# Altium schematic symbol library jlcpcb_2025_04_capacitors_extended_0201.schlib: 1175 symbols (part 7 of 7)
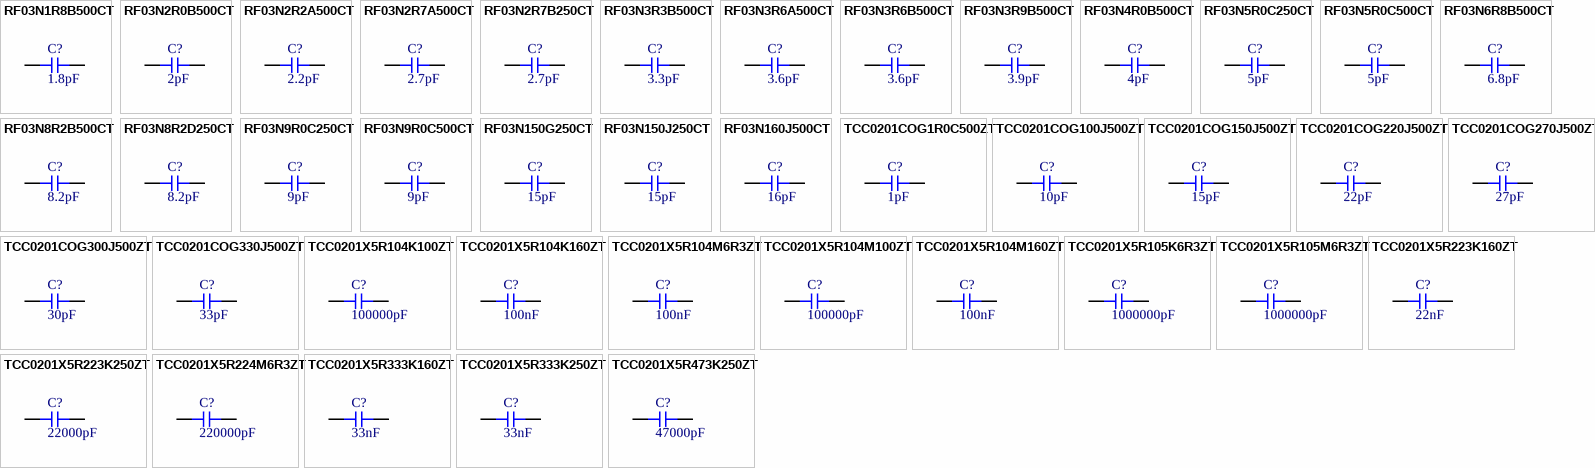
[diagram p35: symbols RF03N1R8B500CT to TCC0201X5R473K250ZT]

## TCC0201COG330J500ZT
designator C?  Capacitance: 33pF  (hidden comment: *)
Capacitor, Ceramic (MLCC), 33pF, ±5%, 50V, C0G, ±5%, SMD 0201; Manufacturer: CCTC; Manufacturer Part Number: TCC0201COG330J500ZT; Package Size: 0201; JLCPCB Basic Part: No; JLCPCB Part Number: C5142543; Supplier 1: LCSC; Category: Capacitors - MLCC; Supplier Part Number 1: C5142543; Tolerance: ±5%; Voltage Rating: 50V; Temperature Coefficient: C0G; RoHS: Yes; ComponentLink1Description: Datasheet; ComponentLink1URL: https://wmsc.lcsc.com/wmsc/upload/file/pdf/v2/lcsc/2209011730_CCTC-TCC0201COG330J500ZT_C5142543.pdf; ComponentLink2Description: JLCPCB Part URL; ComponentLink2URL: https://jlcpcb.com/partdetail/C5142543; ComponentLink3Description: LCSC Part URL; ComponentLink3URL: https://lcsc.com/product-detail/Multilayer-Ceramic-Capacitors-MLCC---SMD-SMT_CCTC-CCTC-TCC0201COG330J500ZT_C5142543.html
footprint CAP-0201 (0201 (0603M) Capacitor)
pins: 1, 2

## TCC0201X5R104K100ZT
designator C?  Capacitance: 100000pF  (hidden comment: *)
Capacitor, Ceramic (MLCC), 100000pF, ±10%, 10V, X5R, ±10%, SMD 0201; Manufacturer: CCTC; Manufacturer Part Number: TCC0201X5R104K100ZT; Package Size: 0201; JLCPCB Basic Part: No; JLCPCB Part Number: C5142565; Supplier 1: LCSC; Category: Capacitors - MLCC; Supplier Part Number 1: C5142565; Tolerance: ±10%; Voltage Rating: 10V; Temperature Coefficient: X5R; RoHS: Yes; ComponentLink1Description: Datasheet; ComponentLink1URL: https://wmsc.lcsc.com/wmsc/upload/file/pdf/v2/lcsc/2209011730_CCTC-TCC0201X5R104K100ZT_C5142565.pdf; ComponentLink2Description: JLCPCB Part URL; ComponentLink2URL: https://jlcpcb.com/partdetail/C5142565; ComponentLink3Description: LCSC Part URL; ComponentLink3URL: https://lcsc.com/product-detail/Multilayer-Ceramic-Capacitors-MLCC---SMD-SMT_CCTC-CCTC-TCC0201X5R104K100ZT_C5142565.html
footprint CAP-0201 (0201 (0603M) Capacitor)
pins: 1, 2

## TCC0201X5R104K160ZT
designator C?  Capacitance: 100nF  (hidden comment: *)
Capacitor, Ceramic (MLCC), 100nF, ±10%, 16V, X5R, ±10%, SMD 0201; Manufacturer: CCTC; Manufacturer Part Number: TCC0201X5R104K160ZT; Package Size: 0201; JLCPCB Basic Part: No; JLCPCB Part Number: C2903663; Supplier 1: LCSC; Category: Capacitors - MLCC; Supplier Part Number 1: C2903663; Tolerance: ±10%; Voltage Rating: 16V; Temperature Coefficient: X5R; RoHS: Yes; ComponentLink1Description: Datasheet; ComponentLink1URL: https://wmsc.lcsc.com/wmsc/upload/file/pdf/v2/lcsc/2110101130_CCTC-TCC0201X5R104K160ZT_C2903663.pdf; ComponentLink2Description: JLCPCB Part URL; ComponentLink2URL: https://jlcpcb.com/partdetail/C2903663; ComponentLink3Description: LCSC Part URL; ComponentLink3URL: https://lcsc.com/product-detail/Multilayer-Ceramic-Capacitors-MLCC---SMD-SMT_CCTC-CCTC-TCC0201X5R104K160ZT_C2903663.html
footprint CAP-0201 (0201 (0603M) Capacitor)
pins: 1, 2

## TCC0201X5R104M6R3ZT
designator C?  Capacitance: 100nF  (hidden comment: *)
Capacitor, Ceramic (MLCC), 100nF, 6.3V, Y5V, SMD 0201; Manufacturer: CCTC; Manufacturer Part Number: TCC0201X5R104M6R3ZT; Package Size: 0201; JLCPCB Basic Part: No; JLCPCB Part Number: C2903664; Supplier 1: LCSC; Category: Capacitors - MLCC; Supplier Part Number 1: C2903664; Voltage Rating: 6.3V; Temperature Coefficient: Y5V; RoHS: Yes; ComponentLink1Description: Datasheet; ComponentLink1URL: https://wmsc.lcsc.com/wmsc/upload/file/pdf/v2/lcsc/2110101130_CCTC-TCC0201X5R104M6R3ZT_C2903664.pdf; ComponentLink2Description: JLCPCB Part URL; ComponentLink2URL: https://jlcpcb.com/partdetail/C2903664; ComponentLink3Description: LCSC Part URL; ComponentLink3URL: https://lcsc.com/product-detail/Multilayer-Ceramic-Capacitors-MLCC---SMD-SMT_CCTC-CCTC-TCC0201X5R104M6R3ZT_C2903664.html
footprint CAP-0201 (0201 (0603M) Capacitor)
pins: 1, 2

## TCC0201X5R104M100ZT
designator C?  Capacitance: 100000pF  (hidden comment: *)
Capacitor, Ceramic (MLCC), 100000pF, ±20%, 10V, X5R, ±20%, SMD 0201; Manufacturer: CCTC; Manufacturer Part Number: TCC0201X5R104M100ZT; Package Size: 0201; JLCPCB Basic Part: No; JLCPCB Part Number: C5142537; Supplier 1: LCSC; Category: Capacitors - MLCC; Supplier Part Number 1: C5142537; Tolerance: ±20%; Voltage Rating: 10V; Temperature Coefficient: X5R; RoHS: Yes; ComponentLink1Description: Datasheet; ComponentLink1URL: https://wmsc.lcsc.com/wmsc/upload/file/pdf/v2/lcsc/2209011730_CCTC-TCC0201X5R104M100ZT_C5142537.pdf; ComponentLink2Description: JLCPCB Part URL; ComponentLink2URL: https://jlcpcb.com/partdetail/C5142537; ComponentLink3Description: LCSC Part URL; ComponentLink3URL: https://lcsc.com/product-detail/Multilayer-Ceramic-Capacitors-MLCC---SMD-SMT_CCTC-CCTC-TCC0201X5R104M100ZT_C5142537.html
footprint CAP-0201 (0201 (0603M) Capacitor)
pins: 1, 2

## TCC0201X5R104M160ZT
designator C?  Capacitance: 100nF  (hidden comment: *)
Capacitor, Ceramic (MLCC), 100nF, ±20%, 16V, X5R, ±20%, SMD 0201; Manufacturer: CCTC; Manufacturer Part Number: TCC0201X5R104M160ZT; Package Size: 0201; JLCPCB Basic Part: No; JLCPCB Part Number: C7393831; Supplier 1: LCSC; Category: Capacitors - MLCC; Supplier Part Number 1: C7393831; Tolerance: ±20%; Voltage Rating: 16V; Temperature Coefficient: X5R; RoHS: Yes; ComponentLink1Description: Datasheet; ComponentLink1URL: https://wmsc.lcsc.com/wmsc/upload/file/pdf/v2/lcsc/2306211554_CCTC-TCC0201X5R104M160ZT_C7393831.pdf; ComponentLink2Description: JLCPCB Part URL; ComponentLink2URL: https://jlcpcb.com/partdetail/C7393831; ComponentLink3Description: LCSC Part URL; ComponentLink3URL: https://lcsc.com/product-detail/Multilayer-Ceramic-Capacitors-MLCC---SMD-SMT_CCTC-CCTC-TCC0201X5R104M160ZT_C7393831.html
footprint CAP-0201 (0201 (0603M) Capacitor)
pins: 1, 2

## TCC0201X5R105K6R3ZT
designator C?  Capacitance: 1000000pF  (hidden comment: *)
Capacitor, Ceramic (MLCC), 1000000pF, ±10%, 6.3V, X5R, ±10%, SMD 0201; Manufacturer: CCTC; Manufacturer Part Number: TCC0201X5R105K6R3ZT; Package Size: 0201; JLCPCB Basic Part: No; JLCPCB Part Number: C5142566; Supplier 1: LCSC; Category: Capacitors - MLCC; Supplier Part Number 1: C5142566; Tolerance: ±10%; Voltage Rating: 6.3V; Temperature Coefficient: X5R; RoHS: Yes; ComponentLink1Description: Datasheet; ComponentLink1URL: https://wmsc.lcsc.com/wmsc/upload/file/pdf/v2/lcsc/2209011730_CCTC-TCC0201X5R105K6R3ZT_C5142566.pdf; ComponentLink2Description: JLCPCB Part URL; ComponentLink2URL: https://jlcpcb.com/partdetail/C5142566; ComponentLink3Description: LCSC Part URL; ComponentLink3URL: https://lcsc.com/product-detail/Multilayer-Ceramic-Capacitors-MLCC---SMD-SMT_CCTC-CCTC-TCC0201X5R105K6R3ZT_C5142566.html
footprint CAP-0201 (0201 (0603M) Capacitor)
pins: 1, 2

## TCC0201X5R105M6R3ZT
designator C?  Capacitance: 1000000pF  (hidden comment: *)
Capacitor, Ceramic (MLCC), 1000000pF, ±20%, 6.3V, X5R, ±20%, SMD 0201; Manufacturer: CCTC; Manufacturer Part Number: TCC0201X5R105M6R3ZT; Package Size: 0201; JLCPCB Basic Part: No; JLCPCB Part Number: C5142562; Supplier 1: LCSC; Category: Capacitors - MLCC; Supplier Part Number 1: C5142562; Tolerance: ±20%; Voltage Rating: 6.3V; Temperature Coefficient: X5R; RoHS: Yes; ComponentLink1Description: Datasheet; ComponentLink1URL: https://wmsc.lcsc.com/wmsc/upload/file/pdf/v2/lcsc/2209011730_CCTC-TCC0201X5R105M6R3ZT_C5142562.pdf; ComponentLink2Description: JLCPCB Part URL; ComponentLink2URL: https://jlcpcb.com/partdetail/C5142562; ComponentLink3Description: LCSC Part URL; ComponentLink3URL: https://lcsc.com/product-detail/Multilayer-Ceramic-Capacitors-MLCC---SMD-SMT_CCTC-CCTC-TCC0201X5R105M6R3ZT_C5142562.html
footprint CAP-0201 (0201 (0603M) Capacitor)
pins: 1, 2

## TCC0201X5R223K160ZT
designator C?  Capacitance: 22nF  (hidden comment: *)
Capacitor, Ceramic (MLCC), 22nF, ±10%, 16V, X5R, ±10%, SMD 0201; Manufacturer: CCTC; Manufacturer Part Number: TCC0201X5R223K160ZT; Package Size: 0201; JLCPCB Basic Part: No; JLCPCB Part Number: C18164585; Supplier 1: LCSC; Category: Capacitors - MLCC; Supplier Part Number 1: C18164585; Tolerance: ±10%; Voltage Rating: 16V; Temperature Coefficient: X5R; RoHS: Yes; ComponentLink1Description: Datasheet; ComponentLink1URL: https://wmsc.lcsc.com/wmsc/upload/file/pdf/v2/lcsc/2309141701_CCTC-TCC0201X5R223K160ZT_C18164585.pdf; ComponentLink2Description: JLCPCB Part URL; ComponentLink2URL: https://jlcpcb.com/partdetail/C18164585; ComponentLink3Description: LCSC Part URL; ComponentLink3URL: https://lcsc.com/product-detail/Multilayer-Ceramic-Capacitors-MLCC---SMD-SMT_CCTC-CCTC-TCC0201X5R223K160ZT_C18164585.html
footprint CAP-0201 (0201 (0603M) Capacitor)
pins: 1, 2

## TCC0201X5R223K250ZT
designator C?  Capacitance: 22000pF  (hidden comment: *)
Capacitor, Ceramic (MLCC), 22000pF, ±10%, 25V, X5R, ±10%, SMD 0201; Manufacturer: CCTC; Manufacturer Part Number: TCC0201X5R223K250ZT; Package Size: 0201; JLCPCB Basic Part: No; JLCPCB Part Number: C5142560; Supplier 1: LCSC; Category: Capacitors - MLCC; Supplier Part Number 1: C5142560; Tolerance: ±10%; Voltage Rating: 25V; Temperature Coefficient: X5R; RoHS: Yes; ComponentLink1Description: Datasheet; ComponentLink1URL: https://wmsc.lcsc.com/wmsc/upload/file/pdf/v2/lcsc/2209011730_CCTC-TCC0201X5R223K250ZT_C5142560.pdf; ComponentLink2Description: JLCPCB Part URL; ComponentLink2URL: https://jlcpcb.com/partdetail/C5142560; ComponentLink3Description: LCSC Part URL; ComponentLink3URL: https://lcsc.com/product-detail/Multilayer-Ceramic-Capacitors-MLCC---SMD-SMT_CCTC-CCTC-TCC0201X5R223K250ZT_C5142560.html
footprint CAP-0201 (0201 (0603M) Capacitor)
pins: 1, 2

## TCC0201X5R224M6R3ZT
designator C?  Capacitance: 220000pF  (hidden comment: *)
Capacitor, Ceramic (MLCC), 220000pF, ±20%, 6.3V, X5R, ±20%, SMD 0201; Manufacturer: CCTC; Manufacturer Part Number: TCC0201X5R224M6R3ZT; Package Size: 0201; JLCPCB Basic Part: No; JLCPCB Part Number: C5142538; Supplier 1: LCSC; Category: Capacitors - MLCC; Supplier Part Number 1: C5142538; Tolerance: ±20%; Voltage Rating: 6.3V; Temperature Coefficient: X5R; RoHS: Yes; ComponentLink1Description: Datasheet; ComponentLink1URL: https://wmsc.lcsc.com/wmsc/upload/file/pdf/v2/lcsc/2209011730_CCTC-TCC0201X5R224M6R3ZT_C5142538.pdf; ComponentLink2Description: JLCPCB Part URL; ComponentLink2URL: https://jlcpcb.com/partdetail/C5142538; ComponentLink3Description: LCSC Part URL; ComponentLink3URL: https://lcsc.com/product-detail/Multilayer-Ceramic-Capacitors-MLCC---SMD-SMT_CCTC-CCTC-TCC0201X5R224M6R3ZT_C5142538.html
footprint CAP-0201 (0201 (0603M) Capacitor)
pins: 1, 2

## TCC0201X5R333K160ZT
designator C?  Capacitance: 33nF  (hidden comment: *)
Capacitor, Ceramic (MLCC), 33nF, ±10%, 16V, X5R, ±10%, SMD 0201; Manufacturer: CCTC; Manufacturer Part Number: TCC0201X5R333K160ZT; Package Size: 0201; JLCPCB Basic Part: No; JLCPCB Part Number: C7393832; Supplier 1: LCSC; Category: Capacitors - MLCC; Supplier Part Number 1: C7393832; Tolerance: ±10%; Voltage Rating: 16V; Temperature Coefficient: X5R; RoHS: Yes; ComponentLink1Description: Datasheet; ComponentLink1URL: https://wmsc.lcsc.com/wmsc/upload/file/pdf/v2/lcsc/2306211554_CCTC-TCC0201X5R333K160ZT_C7393832.pdf; ComponentLink2Description: JLCPCB Part URL; ComponentLink2URL: https://jlcpcb.com/partdetail/C7393832; ComponentLink3Description: LCSC Part URL; ComponentLink3URL: https://lcsc.com/product-detail/Multilayer-Ceramic-Capacitors-MLCC---SMD-SMT_CCTC-CCTC-TCC0201X5R333K160ZT_C7393832.html
footprint CAP-0201 (0201 (0603M) Capacitor)
pins: 1, 2

## TCC0201X5R333K250ZT
designator C?  Capacitance: 33nF  (hidden comment: *)
Capacitor, Ceramic (MLCC), 33nF, ±10%, 25V, X5R, ±10%, SMD 0201; Manufacturer: CCTC; Manufacturer Part Number: TCC0201X5R333K250ZT; Package Size: 0201; JLCPCB Basic Part: No; JLCPCB Part Number: C5142554; Supplier 1: LCSC; Category: Capacitors - MLCC; Supplier Part Number 1: C5142554; Tolerance: ±10%; Voltage Rating: 25V; Temperature Coefficient: X5R; RoHS: Yes; ComponentLink1Description: Datasheet; ComponentLink1URL: https://wmsc.lcsc.com/wmsc/upload/file/pdf/v2/lcsc/2209011730_CCTC-TCC0201X5R333K250ZT_C5142554.pdf; ComponentLink2Description: JLCPCB Part URL; ComponentLink2URL: https://jlcpcb.com/partdetail/C5142554; ComponentLink3Description: LCSC Part URL; ComponentLink3URL: https://lcsc.com/product-detail/Multilayer-Ceramic-Capacitors-MLCC---SMD-SMT_CCTC-CCTC-TCC0201X5R333K250ZT_C5142554.html
footprint CAP-0201 (0201 (0603M) Capacitor)
pins: 1, 2

## TCC0201X5R473K250ZT
designator C?  Capacitance: 47000pF  (hidden comment: *)
Capacitor, Ceramic (MLCC), 47000pF, ±10%, 25V, X5R, ±10%, SMD 0201; Manufacturer: CCTC; Manufacturer Part Number: TCC0201X5R473K250ZT; Package Size: 0201; JLCPCB Basic Part: No; JLCPCB Part Number: C5142564; Supplier 1: LCSC; Category: Capacitors - MLCC; Supplier Part Number 1: C5142564; Tolerance: ±10%; Voltage Rating: 25V; Temperature Coefficient: X5R; RoHS: Yes; ComponentLink1Description: Datasheet; ComponentLink1URL: https://wmsc.lcsc.com/wmsc/upload/file/pdf/v2/lcsc/2209011730_CCTC-TCC0201X5R473K250ZT_C5142564.pdf; ComponentLink2Description: JLCPCB Part URL; ComponentLink2URL: https://jlcpcb.com/partdetail/C5142564; ComponentLink3Description: LCSC Part URL; ComponentLink3URL: https://lcsc.com/product-detail/Multilayer-Ceramic-Capacitors-MLCC---SMD-SMT_CCTC-CCTC-TCC0201X5R473K250ZT_C5142564.html
footprint CAP-0201 (0201 (0603M) Capacitor)
pins: 1, 2

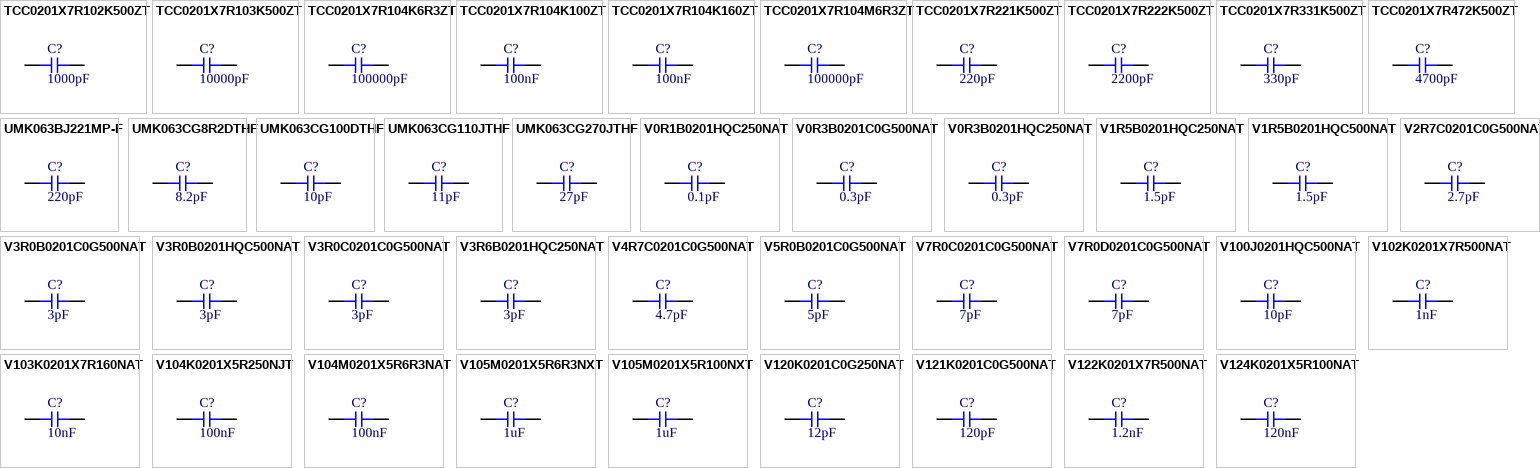
[diagram p28: symbols TCC0201X7R102K500ZT to V124K0201X5R100NAT]

## TCC0201X7R102K500ZT
designator C?  Capacitance: 1000pF  (hidden comment: *)
Capacitor, Ceramic (MLCC), 1000pF, ±10%, 50V, X7R, ±10%, SMD 0201; Manufacturer: CCTC; Manufacturer Part Number: TCC0201X7R102K500ZT; Package Size: 0201; JLCPCB Basic Part: No; JLCPCB Part Number: C5142559; Supplier 1: LCSC; Category: Capacitors - MLCC; Supplier Part Number 1: C5142559; Tolerance: ±10%; Voltage Rating: 50V; Temperature Coefficient: X7R; RoHS: Yes; ComponentLink1Description: Datasheet; ComponentLink1URL: https://wmsc.lcsc.com/wmsc/upload/file/pdf/v2/lcsc/2209011730_CCTC-TCC0201X7R102K500ZT_C5142559.pdf; ComponentLink2Description: JLCPCB Part URL; ComponentLink2URL: https://jlcpcb.com/partdetail/C5142559; ComponentLink3Description: LCSC Part URL; ComponentLink3URL: https://lcsc.com/product-detail/Multilayer-Ceramic-Capacitors-MLCC---SMD-SMT_CCTC-CCTC-TCC0201X7R102K500ZT_C5142559.html
footprint CAP-0201 (0201 (0603M) Capacitor)
pins: 1, 2

## TCC0201X7R103K500ZT
designator C?  Capacitance: 10000pF  (hidden comment: *)
Capacitor, Ceramic (MLCC), 10000pF, ±10%, 50V, X7R, ±10%, SMD 0201; Manufacturer: CCTC; Manufacturer Part Number: TCC0201X7R103K500ZT; Package Size: 0201; JLCPCB Basic Part: No; JLCPCB Part Number: C5142551; Supplier 1: LCSC; Category: Capacitors - MLCC; Supplier Part Number 1: C5142551; Tolerance: ±10%; Voltage Rating: 50V; Temperature Coefficient: X7R; RoHS: Yes; ComponentLink1Description: Datasheet; ComponentLink1URL: https://wmsc.lcsc.com/wmsc/upload/file/pdf/v2/lcsc/2209011730_CCTC-TCC0201X7R103K500ZT_C5142551.pdf; ComponentLink2Description: JLCPCB Part URL; ComponentLink2URL: https://jlcpcb.com/partdetail/C5142551; ComponentLink3Description: LCSC Part URL; ComponentLink3URL: https://lcsc.com/product-detail/Multilayer-Ceramic-Capacitors-MLCC---SMD-SMT_CCTC-CCTC-TCC0201X7R103K500ZT_C5142551.html
footprint CAP-0201 (0201 (0603M) Capacitor)
pins: 1, 2

## TCC0201X7R104K6R3ZT
designator C?  Capacitance: 100000pF  (hidden comment: *)
Capacitor, Ceramic (MLCC), 100000pF, ±10%, 6.3V, X7R, ±10%, SMD 0201; Manufacturer: CCTC; Manufacturer Part Number: TCC0201X7R104K6R3ZT; Package Size: 0201; JLCPCB Basic Part: No; JLCPCB Part Number: C5142541; Supplier 1: LCSC; Category: Capacitors - MLCC; Supplier Part Number 1: C5142541; Tolerance: ±10%; Voltage Rating: 6.3V; Temperature Coefficient: X7R; RoHS: Yes; ComponentLink1Description: Datasheet; ComponentLink1URL: https://wmsc.lcsc.com/wmsc/upload/file/pdf/v2/lcsc/2209011730_CCTC-TCC0201X7R104K6R3ZT_C5142541.pdf; ComponentLink2Description: JLCPCB Part URL; ComponentLink2URL: https://jlcpcb.com/partdetail/C5142541; ComponentLink3Description: LCSC Part URL; ComponentLink3URL: https://lcsc.com/product-detail/Multilayer-Ceramic-Capacitors-MLCC---SMD-SMT_CCTC-CCTC-TCC0201X7R104K6R3ZT_C5142541.html
footprint CAP-0201 (0201 (0603M) Capacitor)
pins: 1, 2

## TCC0201X7R104K100ZT
designator C?  Capacitance: 100nF  (hidden comment: *)
Capacitor, Ceramic (MLCC), 100nF, ±10%, 10V, X7R, ±10%, SMD 0201; Manufacturer: CCTC; Manufacturer Part Number: TCC0201X7R104K100ZT; Package Size: 0201; JLCPCB Basic Part: No; JLCPCB Part Number: C7393837; Supplier 1: LCSC; Category: Capacitors - MLCC; Supplier Part Number 1: C7393837; Tolerance: ±10%; Voltage Rating: 10V; Temperature Coefficient: X7R; RoHS: Yes; ComponentLink1Description: Datasheet; ComponentLink1URL: https://wmsc.lcsc.com/wmsc/upload/file/pdf/v2/lcsc/2306211554_CCTC-TCC0201X7R104K100ZT_C7393837.pdf; ComponentLink2Description: JLCPCB Part URL; ComponentLink2URL: https://jlcpcb.com/partdetail/C7393837; ComponentLink3Description: LCSC Part URL; ComponentLink3URL: https://lcsc.com/product-detail/Multilayer-Ceramic-Capacitors-MLCC---SMD-SMT_CCTC-CCTC-TCC0201X7R104K100ZT_C7393837.html
footprint CAP-0201 (0201 (0603M) Capacitor)
pins: 1, 2

## TCC0201X7R104K160ZT
designator C?  Capacitance: 100nF  (hidden comment: *)
Capacitor, Ceramic (MLCC), 100nF, ±10%, 16V, X7R, ±10%, SMD 0201; Manufacturer: CCTC; Manufacturer Part Number: TCC0201X7R104K160ZT; Package Size: 0201; JLCPCB Basic Part: No; JLCPCB Part Number: C18164586; Supplier 1: LCSC; Category: Capacitors - MLCC; Supplier Part Number 1: C18164586; Tolerance: ±10%; Voltage Rating: 16V; Temperature Coefficient: X7R; RoHS: Yes; ComponentLink1Description: Datasheet; ComponentLink1URL: https://wmsc.lcsc.com/wmsc/upload/file/pdf/v2/lcsc/2309141701_CCTC-TCC0201X7R104K160ZT_C18164586.pdf; ComponentLink2Description: JLCPCB Part URL; ComponentLink2URL: https://jlcpcb.com/partdetail/C18164586; ComponentLink3Description: LCSC Part URL; ComponentLink3URL: https://lcsc.com/product-detail/Multilayer-Ceramic-Capacitors-MLCC---SMD-SMT_CCTC-CCTC-TCC0201X7R104K160ZT_C18164586.html
footprint CAP-0201 (0201 (0603M) Capacitor)
pins: 1, 2

## TCC0201X7R104M6R3ZT
designator C?  Capacitance: 100000pF  (hidden comment: *)
Capacitor, Ceramic (MLCC), 100000pF, ±20%, 6.3V, X7R, ±20%, SMD 0201; Manufacturer: CCTC; Manufacturer Part Number: TCC0201X7R104M6R3ZT; Package Size: 0201; JLCPCB Basic Part: No; JLCPCB Part Number: C5142563; Supplier 1: LCSC; Category: Capacitors - MLCC; Supplier Part Number 1: C5142563; Tolerance: ±20%; Voltage Rating: 6.3V; Temperature Coefficient: X7R; RoHS: Yes; ComponentLink1Description: Datasheet; ComponentLink1URL: https://wmsc.lcsc.com/wmsc/upload/file/pdf/v2/lcsc/2209011730_CCTC-TCC0201X7R104M6R3ZT_C5142563.pdf; ComponentLink2Description: JLCPCB Part URL; ComponentLink2URL: https://jlcpcb.com/partdetail/C5142563; ComponentLink3Description: LCSC Part URL; ComponentLink3URL: https://lcsc.com/product-detail/Multilayer-Ceramic-Capacitors-MLCC---SMD-SMT_CCTC-CCTC-TCC0201X7R104M6R3ZT_C5142563.html
footprint CAP-0201 (0201 (0603M) Capacitor)
pins: 1, 2

## TCC0201X7R221K500ZT
designator C?  Capacitance: 220pF  (hidden comment: *)
Capacitor, Ceramic (MLCC), 220pF, ±10%, 50V, X7R, ±10%, SMD 0201; Manufacturer: CCTC; Manufacturer Part Number: TCC0201X7R221K500ZT; Package Size: 0201; JLCPCB Basic Part: No; JLCPCB Part Number: C5142555; Supplier 1: LCSC; Category: Capacitors - MLCC; Supplier Part Number 1: C5142555; Tolerance: ±10%; Voltage Rating: 50V; Temperature Coefficient: X7R; RoHS: Yes; ComponentLink1Description: Datasheet; ComponentLink1URL: https://wmsc.lcsc.com/wmsc/upload/file/pdf/v2/lcsc/2209011730_CCTC-TCC0201X7R221K500ZT_C5142555.pdf; ComponentLink2Description: JLCPCB Part URL; ComponentLink2URL: https://jlcpcb.com/partdetail/C5142555; ComponentLink3Description: LCSC Part URL; ComponentLink3URL: https://lcsc.com/product-detail/Multilayer-Ceramic-Capacitors-MLCC---SMD-SMT_CCTC-CCTC-TCC0201X7R221K500ZT_C5142555.html
footprint CAP-0201 (0201 (0603M) Capacitor)
pins: 1, 2

## TCC0201X7R222K500ZT
designator C?  Capacitance: 2200pF  (hidden comment: *)
Capacitor, Ceramic (MLCC), 2200pF, ±10%, 50V, X7R, ±10%, SMD 0201; Manufacturer: CCTC; Manufacturer Part Number: TCC0201X7R222K500ZT; Package Size: 0201; JLCPCB Basic Part: No; JLCPCB Part Number: C5142540; Supplier 1: LCSC; Category: Capacitors - MLCC; Supplier Part Number 1: C5142540; Tolerance: ±10%; Voltage Rating: 50V; Temperature Coefficient: X7R; RoHS: Yes; ComponentLink1Description: Datasheet; ComponentLink1URL: https://wmsc.lcsc.com/wmsc/upload/file/pdf/v2/lcsc/2209011730_CCTC-TCC0201X7R222K500ZT_C5142540.pdf; ComponentLink2Description: JLCPCB Part URL; ComponentLink2URL: https://jlcpcb.com/partdetail/C5142540; ComponentLink3Description: LCSC Part URL; ComponentLink3URL: https://lcsc.com/product-detail/Multilayer-Ceramic-Capacitors-MLCC---SMD-SMT_CCTC-CCTC-TCC0201X7R222K500ZT_C5142540.html
footprint CAP-0201 (0201 (0603M) Capacitor)
pins: 1, 2

## TCC0201X7R331K500ZT
designator C?  Capacitance: 330pF  (hidden comment: *)
Capacitor, Ceramic (MLCC), 330pF, ±10%, 50V, X7R, ±10%, SMD 0201; Manufacturer: CCTC; Manufacturer Part Number: TCC0201X7R331K500ZT; Package Size: 0201; JLCPCB Basic Part: No; JLCPCB Part Number: C5142553; Supplier 1: LCSC; Category: Capacitors - MLCC; Supplier Part Number 1: C5142553; Tolerance: ±10%; Voltage Rating: 50V; Temperature Coefficient: X7R; RoHS: Yes; ComponentLink1Description: Datasheet; ComponentLink1URL: https://wmsc.lcsc.com/wmsc/upload/file/pdf/v2/lcsc/2209011730_CCTC-TCC0201X7R331K500ZT_C5142553.pdf; ComponentLink2Description: JLCPCB Part URL; ComponentLink2URL: https://jlcpcb.com/partdetail/C5142553; ComponentLink3Description: LCSC Part URL; ComponentLink3URL: https://lcsc.com/product-detail/Multilayer-Ceramic-Capacitors-MLCC---SMD-SMT_CCTC-CCTC-TCC0201X7R331K500ZT_C5142553.html
footprint CAP-0201 (0201 (0603M) Capacitor)
pins: 1, 2

## TCC0201X7R472K500ZT
designator C?  Capacitance: 4700pF  (hidden comment: *)
Capacitor, Ceramic (MLCC), 4700pF, ±10%, 50V, X7R, ±10%, SMD 0201; Manufacturer: CCTC; Manufacturer Part Number: TCC0201X7R472K500ZT; Package Size: 0201; JLCPCB Basic Part: No; JLCPCB Part Number: C5142549; Supplier 1: LCSC; Category: Capacitors - MLCC; Supplier Part Number 1: C5142549; Tolerance: ±10%; Voltage Rating: 50V; Temperature Coefficient: X7R; RoHS: Yes; ComponentLink1Description: Datasheet; ComponentLink1URL: https://wmsc.lcsc.com/wmsc/upload/file/pdf/v2/lcsc/2209011730_CCTC-TCC0201X7R472K500ZT_C5142549.pdf; ComponentLink2Description: JLCPCB Part URL; ComponentLink2URL: https://jlcpcb.com/partdetail/C5142549; ComponentLink3Description: LCSC Part URL; ComponentLink3URL: https://lcsc.com/product-detail/Multilayer-Ceramic-Capacitors-MLCC---SMD-SMT_CCTC-CCTC-TCC0201X7R472K500ZT_C5142549.html
footprint CAP-0201 (0201 (0603M) Capacitor)
pins: 1, 2

## UMK063BJ221MP-F
designator C?  Capacitance: 220pF  (hidden comment: *)
Capacitor, Ceramic (MLCC), 220pF, ±20%, 50V, X5R, ±20%, SMD 0201; Manufacturer: Taiyo Yuden; Manufacturer Part Number: UMK063BJ221MP-F; Package Size: 0201; JLCPCB Basic Part: No; JLCPCB Part Number: C524925; Supplier 1: LCSC; Category: Capacitors - MLCC; Supplier Part Number 1: C524925; Tolerance: ±20%; Voltage Rating: 50V; Temperature Coefficient: X5R; RoHS: Yes; ComponentLink1Description: Datasheet; ComponentLink1URL: https://wmsc.lcsc.com/wmsc/upload/file/pdf/v2/lcsc/2304140030_Taiyo-Yuden-UMK063BJ221MP-F_C524925.pdf; ComponentLink2Description: JLCPCB Part URL; ComponentLink2URL: https://jlcpcb.com/partdetail/C524925; ComponentLink3Description: LCSC Part URL; ComponentLink3URL: https://lcsc.com/product-detail/Multilayer-Ceramic-Capacitors-MLCC---SMD-SMT_Taiyo-Yuden-Taiyo-Yuden-UMK063BJ221MP-F_C524925.html
footprint CAP-0201 (0201 (0603M) Capacitor)
pins: 1, 2

## UMK063CG8R2DTHF
designator C?  Capacitance: 8.2pF  (hidden comment: *)
Capacitor, Ceramic (MLCC), 8.2pF, 50V, C0G, SMD 0201; Manufacturer: Taiyo Yuden; Manufacturer Part Number: UMK063CG8R2DTHF; Package Size: 0201; JLCPCB Basic Part: No; JLCPCB Part Number: C2173663; Supplier 1: LCSC; Category: Capacitors - MLCC; Supplier Part Number 1: C2173663; Voltage Rating: 50V; Temperature Coefficient: C0G; RoHS: Yes; ComponentLink1Description: Datasheet; ComponentLink1URL: https://wmsc.lcsc.com/wmsc/upload/file/pdf/v2/lcsc/2309051400_Taiyo-Yuden-UMK063CG8R2DTHF_C2173663.pdf; ComponentLink2Description: JLCPCB Part URL; ComponentLink2URL: https://jlcpcb.com/partdetail/C2173663; ComponentLink3Description: LCSC Part URL; ComponentLink3URL: https://lcsc.com/product-detail/Multilayer-Ceramic-Capacitors-MLCC---SMD-SMT_Taiyo-Yuden-Taiyo-Yuden-UMK063CG8R2DTHF_C2173663.html
footprint CAP-0201 (0201 (0603M) Capacitor)
pins: 1, 2

## UMK063CG100DTHF
designator C?  Capacitance: 10pF  (hidden comment: *)
Capacitor, Ceramic (MLCC), 10pF, 50V, C0G, SMD 0201; Manufacturer: Taiyo Yuden; Manufacturer Part Number: UMK063CG100DTHF; Package Size: 0201; JLCPCB Basic Part: No; JLCPCB Part Number: C2168858; Supplier 1: LCSC; Category: Capacitors - MLCC; Supplier Part Number 1: C2168858; Voltage Rating: 50V; Temperature Coefficient: C0G; RoHS: Yes; ComponentLink1Description: Datasheet; ComponentLink1URL: https://wmsc.lcsc.com/wmsc/upload/file/pdf/v2/lcsc/2309051400_Taiyo-Yuden-UMK063CG100DTHF_C2168858.pdf; ComponentLink2Description: JLCPCB Part URL; ComponentLink2URL: https://jlcpcb.com/partdetail/C2168858; ComponentLink3Description: LCSC Part URL; ComponentLink3URL: https://lcsc.com/product-detail/Multilayer-Ceramic-Capacitors-MLCC---SMD-SMT_Taiyo-Yuden-Taiyo-Yuden-UMK063CG100DTHF_C2168858.html
footprint CAP-0201 (0201 (0603M) Capacitor)
pins: 1, 2

## UMK063CG110JTHF
designator C?  Capacitance: 11pF  (hidden comment: *)
Capacitor, Ceramic (MLCC), 11pF, ±5%, 50V, C0G, ±5%, SMD 0201; Manufacturer: Taiyo Yuden; Manufacturer Part Number: UMK063CG110JTHF; Package Size: 0201; JLCPCB Basic Part: No; JLCPCB Part Number: C2173731; Supplier 1: LCSC; Category: Capacitors - MLCC; Supplier Part Number 1: C2173731; Tolerance: ±5%; Voltage Rating: 50V; Temperature Coefficient: C0G; RoHS: Yes; ComponentLink1Description: Datasheet; ComponentLink1URL: https://wmsc.lcsc.com/wmsc/upload/file/pdf/v2/lcsc/2309051421_Taiyo-Yuden-UMK063CG110JTHF_C2173731.pdf; ComponentLink2Description: JLCPCB Part URL; ComponentLink2URL: https://jlcpcb.com/partdetail/C2173731; ComponentLink3Description: LCSC Part URL; ComponentLink3URL: https://lcsc.com/product-detail/Multilayer-Ceramic-Capacitors-MLCC---SMD-SMT_Taiyo-Yuden-Taiyo-Yuden-UMK063CG110JTHF_C2173731.html
footprint CAP-0201 (0201 (0603M) Capacitor)
pins: 1, 2

## UMK063CG270JTHF
designator C?  Capacitance: 27pF  (hidden comment: *)
Capacitor, Ceramic (MLCC), 27pF, ±5%, 50V, C0G, ±5%, SMD 0201; Manufacturer: Taiyo Yuden; Manufacturer Part Number: UMK063CG270JTHF; Package Size: 0201; JLCPCB Basic Part: No; JLCPCB Part Number: C2173854; Supplier 1: LCSC; Category: Capacitors - MLCC; Supplier Part Number 1: C2173854; Tolerance: ±5%; Voltage Rating: 50V; Temperature Coefficient: C0G; RoHS: Yes; ComponentLink1Description: Datasheet; ComponentLink1URL: https://wmsc.lcsc.com/wmsc/upload/file/pdf/v2/lcsc/2309051359_Taiyo-Yuden-UMK063CG270JTHF_C2173854.pdf; ComponentLink2Description: JLCPCB Part URL; ComponentLink2URL: https://jlcpcb.com/partdetail/C2173854; ComponentLink3Description: LCSC Part URL; ComponentLink3URL: https://lcsc.com/product-detail/Multilayer-Ceramic-Capacitors-MLCC---SMD-SMT_Taiyo-Yuden-Taiyo-Yuden-UMK063CG270JTHF_C2173854.html
footprint CAP-0201 (0201 (0603M) Capacitor)
pins: 1, 2

## V0R1B0201HQC250NAT
designator C?  Capacitance: 0.1pF  (hidden comment: *)
Capacitor, Ceramic (MLCC), 0.1pF, 25V, SMD 0201; Manufacturer: VIIYONG; Manufacturer Part Number: V0R1B0201HQC250NAT; Package Size: 0201; JLCPCB Basic Part: No; JLCPCB Part Number: C2841456; Supplier 1: LCSC; Category: Capacitors - MLCC; Supplier Part Number 1: C2841456; Voltage Rating: 25V; RoHS: Yes; ComponentLink1Description: Datasheet; ComponentLink1URL: https://wmsc.lcsc.com/wmsc/upload/file/pdf/v2/lcsc/2202132030_VIIYONG-V0R1B0201HQC250NAT_C2841456.pdf; ComponentLink2Description: JLCPCB Part URL; ComponentLink2URL: https://jlcpcb.com/partdetail/C2841456; ComponentLink3Description: LCSC Part URL; ComponentLink3URL: https://lcsc.com/product-detail/Multilayer-Ceramic-Capacitors-MLCC---SMD-SMT_VIIYONG-VIIYONG-V0R1B0201HQC250NAT_C2841456.html
footprint CAP-0201 (0201 (0603M) Capacitor)
pins: 1, 2

## V0R3B0201C0G500NAT
designator C?  Capacitance: 0.3pF  (hidden comment: *)
Capacitor, Ceramic (MLCC), 0.3pF, 50V, C0G, SMD 0201; Manufacturer: VIIYONG; Manufacturer Part Number: V0R3B0201C0G500NAT; Package Size: 0201; JLCPCB Basic Part: No; JLCPCB Part Number: C609955; Supplier 1: LCSC; Category: Capacitors - MLCC; Supplier Part Number 1: C609955; Voltage Rating: 50V; Temperature Coefficient: C0G; RoHS: Yes; ComponentLink1Description: Datasheet; ComponentLink1URL: https://wmsc.lcsc.com/wmsc/upload/file/pdf/v2/lcsc/2304140030_VIIYONG-V0R3B0201C0G500NAT_C609955.pdf; ComponentLink2Description: JLCPCB Part URL; ComponentLink2URL: https://jlcpcb.com/partdetail/C609955; ComponentLink3Description: LCSC Part URL; ComponentLink3URL: https://lcsc.com/product-detail/Multilayer-Ceramic-Capacitors-MLCC---SMD-SMT_VIIYONG-VIIYONG-V0R3B0201C0G500NAT_C609955.html
footprint CAP-0201 (0201 (0603M) Capacitor)
pins: 1, 2

## V0R3B0201HQC250NAT
designator C?  Capacitance: 0.3pF  (hidden comment: *)
Capacitor, Ceramic (MLCC), 0.3pF, 25V, HQC, SMD 0201; Manufacturer: VIIYONG; Manufacturer Part Number: V0R3B0201HQC250NAT; Package Size: 0201; JLCPCB Basic Part: No; JLCPCB Part Number: C2975893; Supplier 1: LCSC; Category: Capacitors - MLCC; Supplier Part Number 1: C2975893; Voltage Rating: 25V; Temperature Coefficient: HQC; RoHS: Yes; ComponentLink1Description: Datasheet; ComponentLink1URL: https://wmsc.lcsc.com/wmsc/upload/file/pdf/v2/lcsc/2202181430_VIIYONG-V0R3B0201HQC250NAT_C2975893.pdf; ComponentLink2Description: JLCPCB Part URL; ComponentLink2URL: https://jlcpcb.com/partdetail/C2975893; ComponentLink3Description: LCSC Part URL; ComponentLink3URL: https://lcsc.com/product-detail/Multilayer-Ceramic-Capacitors-MLCC---SMD-SMT_VIIYONG-VIIYONG-V0R3B0201HQC250NAT_C2975893.html
footprint CAP-0201 (0201 (0603M) Capacitor)
pins: 1, 2
